# Altium footprint library LukaLIBRARY.PcbLib: 784 footprints (part 34 of 49)
Each footprint in its own frame and in the unit in brackets; x right, y up, seen from the top. Pads: shape width x height; smd on the part's side, far side on the other; paste and mask are expansions set on the pad; w line width, h text height; cw(c..) or ccw(c..) is an arc to the next point about the centre after c.
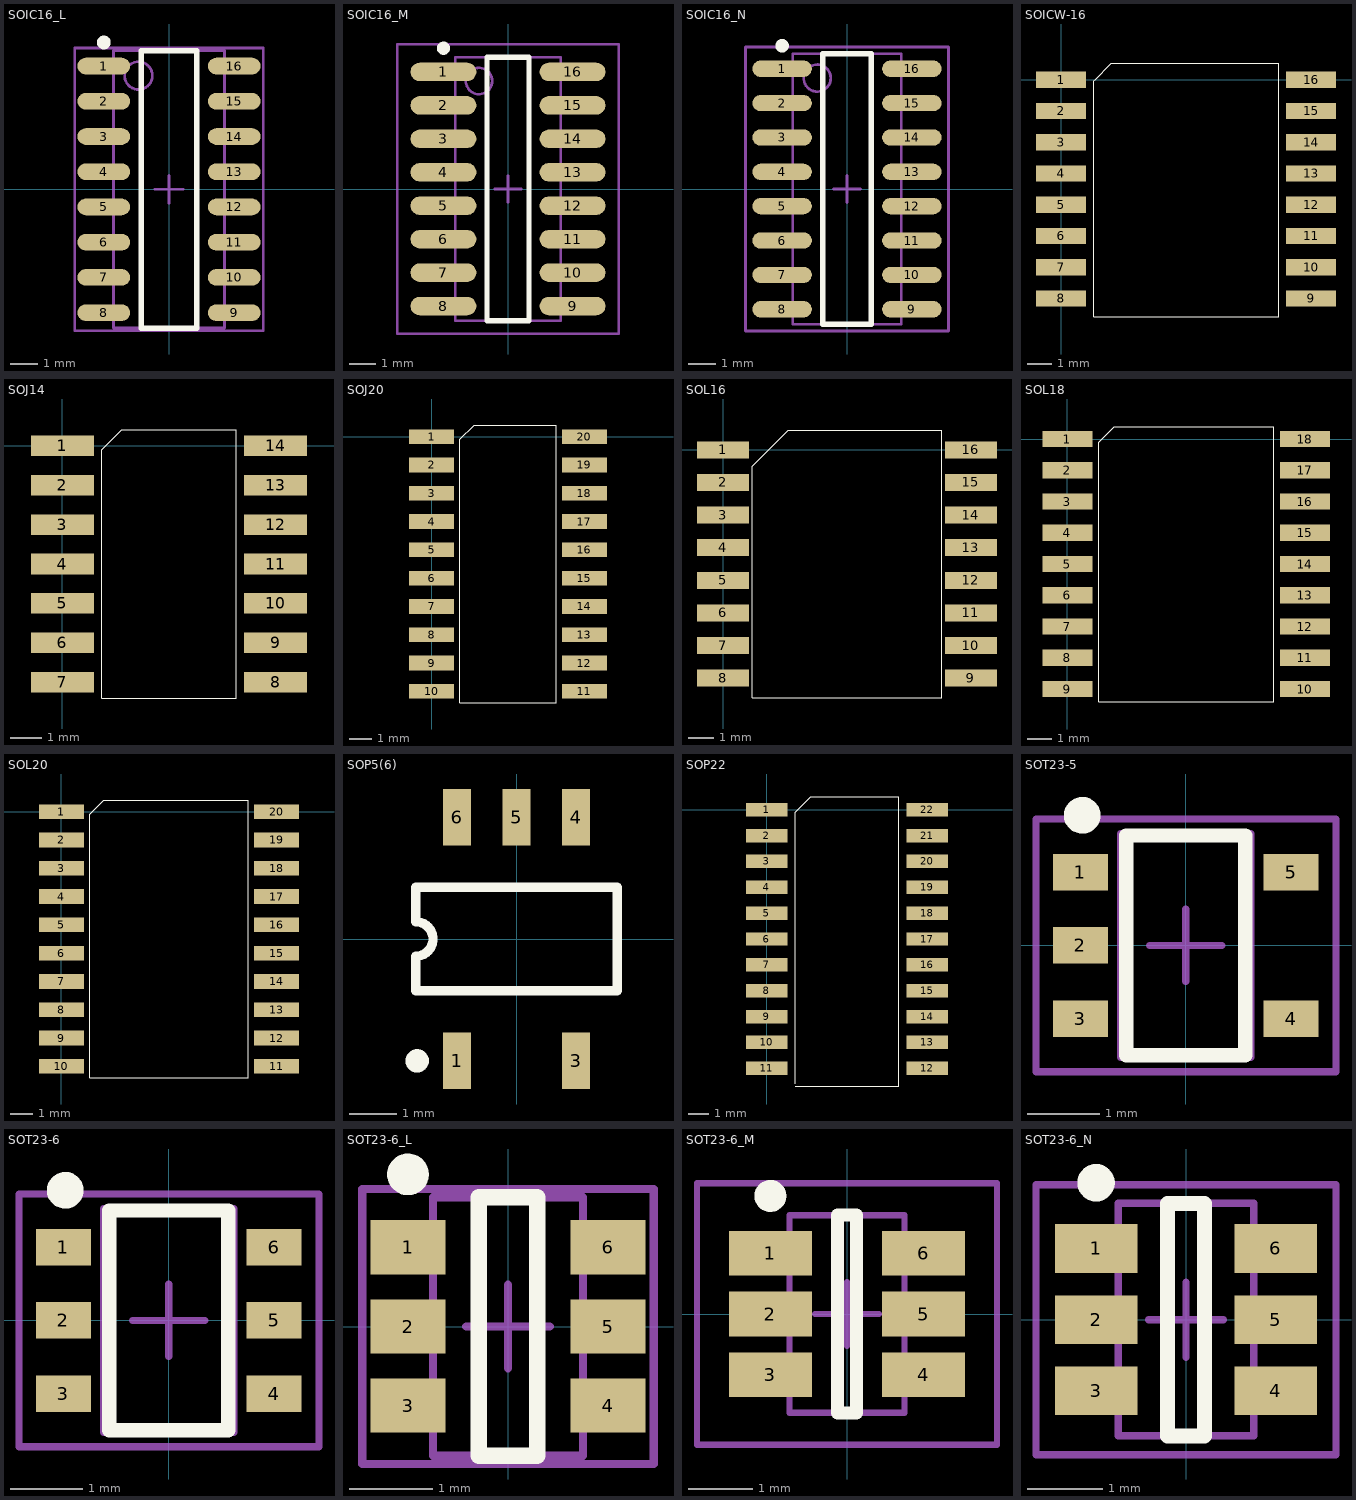
[diagram p33: the footprints below, top view; thin cyan lines are the x and y axes]

## SOIC16_L [mm] "SOIC, 16-Leads, Body 9.9x3.9mm, Pitch 1.27mm, IPC High Density"
height 1.91
pads (16):
  oval 1.9x0.6 smd: 1(-2.35,4.445) 2(-2.35,3.175) 3(-2.35,1.905) 4(-2.35,0.635) 5(-2.35,-0.635) 6(-2.35,-1.905) 7(-2.35,-3.175) 8(-2.35,-4.445) 9(2.35,-4.445) 10(2.35,-3.175) 11(2.35,-1.905) 12(2.35,-0.635) 13(2.35,0.635) 14(2.35,1.905) 15(2.35,3.175) 16(2.35,4.445)
Top Overlay:
  circle w0.25: c-2.35,5.295 r0.125
  lines w0.2: -1,-5 1,-5 1,5 -1,5 -1,-5
Mechanical 13:
  circle w0.1: c-1.1,4.1 r0.5
  lines w0.1: -2,-5 2,-5 2,5 -2,5 -2,-5
Mechanical 15:
  lines w0.1: -0.5,0 0.5,0 ; 0,-0.5 0,0.5 ; -3.4,-5.1 3.4,-5.1 3.4,5.1 -3.4,5.1 -3.4,-5.1
3D body: height 1.91, standoff 0, extent -2,-5 2,5

## SOIC16_M [mm] "SOIC, 16-Leads, Body 9.9x3.9mm, Pitch 1.27mm, IPC Low Density"
height 1.91
pads (16):
  oval 2.5x0.7 smd: 1(-2.45,4.445) 2(-2.45,3.175) 3(-2.45,1.905) 4(-2.45,0.635) 5(-2.45,-0.635) 6(-2.45,-1.905) 7(-2.45,-3.175) 8(-2.45,-4.445) 9(2.45,-4.445) 10(2.45,-3.175) 11(2.45,-1.905) 12(2.45,-0.635) 13(2.45,0.635) 14(2.45,1.905) 15(2.45,3.175) 16(2.45,4.445)
Top Overlay:
  circle w0.25: c-2.45,5.345 r0.125
  lines w0.2: -0.8,-5 0.8,-5 0.8,5 -0.8,5 -0.8,-5
Mechanical 13:
  circle w0.1: c-1.1,4.1 r0.5
  lines w0.1: -2,-5 2,-5 2,5 -2,5 -2,-5
Mechanical 15:
  lines w0.1: -0.5,0 0.5,0 ; 0,-0.5 0,0.5 ; -4.2,-5.5 4.2,-5.5 4.2,5.5 -4.2,5.5 -4.2,-5.5
3D body: height 1.91, standoff 0, extent -2,-5 2,5

## SOIC16_N [mm] "SOIC, 16-Leads, Body 9.9x3.9mm, Pitch 1.27mm, IPC Medium Density"
height 1.91
pads (16):
  oval 2.2x0.6 smd: 1(-2.4,4.445) 2(-2.4,3.175) 3(-2.4,1.905) 4(-2.4,0.635) 5(-2.4,-0.635) 6(-2.4,-1.905) 7(-2.4,-3.175) 8(-2.4,-4.445) 9(2.4,-4.445) 10(2.4,-3.175) 11(2.4,-1.905) 12(2.4,-0.635) 13(2.4,0.635) 14(2.4,1.905) 15(2.4,3.175) 16(2.4,4.445)
Top Overlay:
  circle w0.25: c-2.4,5.295 r0.125
  lines w0.2: -0.9,-5 -0.9,5 0.9,5 0.9,-5 -0.9,-5
Mechanical 13:
  circle w0.1: c-1.1,4.1 r0.5
  lines w0.1: -2,-5 -2,5 2,5 2,-5 -2,-5
Mechanical 15:
  lines w0.1: -0.5,0 0.5,0 ; 0,-0.5 0,0.5 ; -3.75,-5.25 -3.75,5.25 3.75,5.25 3.75,-5.25 -3.75,-5.25
3D body: height 1.91, standoff 0, extent -2,-5 2,5

## SOICW-16 [mil]
pads (16):
  rect 80x26 smd mask-1000: 1(0,0) 2(0,-50) 3(0,-100) 4(0,-150) 5(0,-200) 6(0,-250) 7(0,-300) 8(0,-350) 9(400,-350) 10(400,-300) 11(400,-250) 12(400,-200) 13(400,-150) 14(400,-100) 15(400,-50) 16(400,0)
Top Overlay:
  lines w1: 52.76,-1.57 52.76,-379.53 348.03,-379.53 348.03,25.98 80.31,25.98 53.94,-1.06
Top Solder:
  region: 360,-113 440,-113 440,-87 360,-87
  region: 360,-13 440,-13 440,13 360,13
  region: 360,-63 440,-63 440,-37 360,-37
  region: 360,-163 440,-163 440,-137 360,-137
  region: 360,-213 440,-213 440,-187 360,-187
  region: 360,-263 440,-263 440,-237 360,-237
  region: 360,-313 440,-313 440,-287 360,-287
  region: 360,-363 440,-363 440,-337 360,-337
  region: -40,-113 40,-113 40,-87 -40,-87
  region: -40,-63 40,-63 40,-37 -40,-37
  region: -40,-13 40,-13 40,13 -40,13
  region: -40,-213 40,-213 40,-187 -40,-187
  region: -40,-163 40,-163 40,-137 -40,-137
  region: -40,-363 40,-363 40,-337 -40,-337
  region: -40,-313 40,-313 40,-287 -40,-287
  region: -40,-263 40,-263 40,-237 -40,-237

## SOJ14 [mil]
pads (14):
  rect 80x26 smd mask-1000: 1(0,0) 2(0,-50) 3(0,-100) 4(0,-150) 5(0,-200) 6(0,-250) 7(0,-300) 8(270,-300) 9(270,-250) 10(270,-200) 11(270,-150) 12(270,-100) 13(270,-50) 14(270,0)
Top Overlay:
  lines w1: 50,-320 50,-5 75,20 220,20 220,-320 50,-320
Top Solder:
  region: -40,-163 40,-163 40,-137 -40,-137
  region: -40,-213 40,-213 40,-187 -40,-187
  region: -40,-263 40,-263 40,-237 -40,-237
  region: -40,-313 40,-313 40,-287 -40,-287
  region: -40,-13 40,-13 40,13 -40,13
  region: -40,-63 40,-63 40,-37 -40,-37
  region: 230,-313 310,-313 310,-287 230,-287
  region: 230,-263 310,-263 310,-237 230,-237
  region: 230,-213 310,-213 310,-187 230,-187
  region: 230,-163 310,-163 310,-137 230,-137
  region: 230,-63 310,-63 310,-37 230,-37
  region: 230,-13 310,-13 310,13 230,13
  region: -40,-113 40,-113 40,-87 -40,-87
  region: 230,-113 310,-113 310,-87 230,-87

## SOJ20 [mil]
pads (20):
  rect 80x26 smd mask-1000: 1(0,0) 2(0,-50) 3(0,-100) 4(0,-150) 5(0,-200) 6(0,-250) 7(0,-300) 8(0,-350) 9(0,-400) 10(0,-450) 11(270,-450) 12(270,-400) 13(270,-350) 14(270,-300) 15(270,-250) 16(270,-200) 17(270,-150) 18(270,-100) 19(270,-50) 20(270,0)
Top Overlay:
  lines w1: 50,-470 50,-5 75,20 220,20 220,-470 50,-470
Top Solder:
  region: -40,-263 40,-263 40,-237 -40,-237
  region: -40,-313 40,-313 40,-287 -40,-287
  region: -40,-363 40,-363 40,-337 -40,-337
  region: -40,-413 40,-413 40,-387 -40,-387
  region: -40,-463 40,-463 40,-437 -40,-437
  region: -40,-13 40,-13 40,13 -40,13
  region: -40,-63 40,-63 40,-37 -40,-37
  region: -40,-113 40,-113 40,-87 -40,-87
  region: -40,-163 40,-163 40,-137 -40,-137
  region: 230,-463 310,-463 310,-437 230,-437
  region: 230,-413 310,-413 310,-387 230,-387
  region: 230,-363 310,-363 310,-337 230,-337
  region: 230,-313 310,-313 310,-287 230,-287
  region: 230,-263 310,-263 310,-237 230,-237
  region: 230,-163 310,-163 310,-137 230,-137
  region: 230,-113 310,-113 310,-87 230,-87
  region: 230,-63 310,-63 310,-37 230,-37
  region: 230,-13 310,-13 310,13 230,13
  region: -40,-213 40,-213 40,-187 -40,-187
  region: 230,-213 310,-213 310,-187 230,-187

## SOL16 [mil]
pads (16):
  rect 80x26 smd mask-1000: 1(0,0) 2(0,-50) 3(0,-100) 4(0,-150) 5(0,-200) 6(0,-250) 7(0,-300) 8(0,-350) 9(380,-350) 10(380,-300) 11(380,-250) 12(380,-200) 13(380,-150) 14(380,-100) 15(380,-50) 16(380,0)
Top Overlay:
  lines w1: 45,-380 45,-25 100,30 335,30 335,-380 45,-380
Top Solder:
  region: -40,-263 40,-263 40,-237 -40,-237
  region: -40,-313 40,-313 40,-287 -40,-287
  region: -40,-363 40,-363 40,-337 -40,-337
  region: -40,-13 40,-13 40,13 -40,13
  region: -40,-63 40,-63 40,-37 -40,-37
  region: -40,-113 40,-113 40,-87 -40,-87
  region: -40,-163 40,-163 40,-137 -40,-137
  region: 340,-363 420,-363 420,-337 340,-337
  region: 340,-313 420,-313 420,-287 340,-287
  region: 340,-263 420,-263 420,-237 340,-237
  region: 340,-163 420,-163 420,-137 340,-137
  region: 340,-113 420,-113 420,-87 340,-87
  region: 340,-63 420,-63 420,-37 340,-37
  region: 340,-13 420,-13 420,13 340,13
  region: -40,-213 40,-213 40,-187 -40,-187
  region: 340,-213 420,-213 420,-187 340,-187

## SOL18 [mil]
pads (18):
  rect 80x26 smd mask-1000: 1(0,0) 2(0,-50) 3(0,-100) 4(0,-150) 5(0,-200) 6(0,-250) 7(0,-300) 8(0,-350) 9(0,-400) 10(380,-400) 11(380,-350) 12(380,-300) 13(380,-250) 14(380,-200) 15(380,-150) 16(380,-100) 17(380,-50) 18(380,0)
Top Overlay:
  lines w1: 50,-420 50,-5 75,20 330,20 330,-420 50,-420
Top Solder:
  region: -40,-263 40,-263 40,-237 -40,-237
  region: -40,-313 40,-313 40,-287 -40,-287
  region: -40,-363 40,-363 40,-337 -40,-337
  region: -40,-413 40,-413 40,-387 -40,-387
  region: -40,-13 40,-13 40,13 -40,13
  region: -40,-63 40,-63 40,-37 -40,-37
  region: -40,-113 40,-113 40,-87 -40,-87
  region: -40,-163 40,-163 40,-137 -40,-137
  region: 340,-413 420,-413 420,-387 340,-387
  region: 340,-363 420,-363 420,-337 340,-337
  region: 340,-313 420,-313 420,-287 340,-287
  region: 340,-263 420,-263 420,-237 340,-237
  region: 340,-163 420,-163 420,-137 340,-137
  region: 340,-113 420,-113 420,-87 340,-87
  region: 340,-63 420,-63 420,-37 340,-37
  region: 340,-13 420,-13 420,13 340,13
  region: -40,-213 40,-213 40,-187 -40,-187
  region: 340,-213 420,-213 420,-187 340,-187

## SOL20 [mil]
pads (20):
  rect 80x26 smd mask-1000: 1(0,0) 2(0,-50) 3(0,-100) 4(0,-150) 5(0,-200) 6(0,-250) 7(0,-300) 8(0,-350) 9(0,-400) 10(0,-450) 11(380,-450) 12(380,-400) 13(380,-350) 14(380,-300) 15(380,-250) 16(380,-200) 17(380,-150) 18(380,-100) 19(380,-50) 20(380,0)
Top Overlay:
  lines w1: 50,-470 50,-5 75,20 330,20 330,-470 50,-470
Top Solder:
  region: -40,-263 40,-263 40,-237 -40,-237
  region: -40,-313 40,-313 40,-287 -40,-287
  region: -40,-363 40,-363 40,-337 -40,-337
  region: -40,-413 40,-413 40,-387 -40,-387
  region: -40,-463 40,-463 40,-437 -40,-437
  region: -40,-13 40,-13 40,13 -40,13
  region: -40,-63 40,-63 40,-37 -40,-37
  region: -40,-113 40,-113 40,-87 -40,-87
  region: -40,-163 40,-163 40,-137 -40,-137
  region: 340,-463 420,-463 420,-437 340,-437
  region: 340,-413 420,-413 420,-387 340,-387
  region: 340,-363 420,-363 420,-337 340,-337
  region: 340,-313 420,-313 420,-287 340,-287
  region: 340,-263 420,-263 420,-237 340,-237
  region: 340,-163 420,-163 420,-137 340,-137
  region: 340,-113 420,-113 420,-87 340,-87
  region: 340,-63 420,-63 420,-37 340,-37
  region: 340,-13 420,-13 420,13 340,13
  region: -40,-213 40,-213 40,-187 -40,-187
  region: 340,-213 420,-213 420,-187 340,-187

## SOP5(6) [mm] "Small Outline; 6 Leads (1 Absent); Body Width 4.4 mm; Pitch 1.27 mm"
height 2.4
pads (5):
  rect 0.6x1.2 smd: 1(-1.27,-2.6) 3(1.27,-2.6) 4(1.27,2.6) 5(0,2.6) 6(-1.27,2.6)
Top Overlay:
  circle w0.25: c-2.12,-2.6 r0.125
  lines w0.2: -2.15,-1.1 2.15,-1.1 2.15,1.1 -2.15,1.1 -2.15,0.367 cw(c-2.15,0) -2.15,-0.367 -2.15,-1.1

## SOP22 [mil]
pads (22):
  rect 80x26 smd mask-1000: 1(0,0) 2(0,-50) 3(0,-100) 4(0,-150) 5(0,-200) 6(0,-250) 7(0,-300) 8(0,-350) 9(0,-400) 10(0,-450) 11(0,-500) 12(310,-500) 13(310,-450) 14(310,-400) 15(310,-350) 16(310,-300) 17(310,-250) 18(310,-200) 19(310,-150) 20(310,-100) 21(310,-50) 22(310,0)
Top Overlay:
  lines w1: 55,-535 255,-535 255,25 85,25 55,-5 55,-530
Top Solder:
  region: -40,-363 40,-363 40,-337 -40,-337
  region: -40,-413 40,-413 40,-387 -40,-387
  region: -40,-463 40,-463 40,-437 -40,-437
  region: 40,-487 -40,-487 -40,-513 40,-513
  region: -40,-63 40,-63 40,-37 -40,-37
  region: -40,-113 40,-113 40,-87 -40,-87
  region: -40,-163 40,-163 40,-137 -40,-137
  region: -40,-213 40,-213 40,-187 -40,-187
  region: -40,-263 40,-263 40,-237 -40,-237
  region: 350,-387 270,-387 270,-413 350,-413
  region: 350,-487 270,-487 270,-513 350,-513
  region: 350,-437 270,-437 270,-463 350,-463
  region: 270,-363 350,-363 350,-337 270,-337
  region: 270,-213 350,-213 350,-187 270,-187
  region: 270,-163 350,-163 350,-137 270,-137
  region: 270,-113 350,-113 350,-87 270,-87
  region: 270,-63 350,-63 350,-37 270,-37
  region: 270,-263 350,-263 350,-237 270,-237
  region: -40,-313 40,-313 40,-287 -40,-287
  region: -40,-13 40,-13 40,13 -40,13
  region: 270,-313 350,-313 350,-287 270,-287
  region: 270,-13 350,-13 350,13 270,13

## SOT23-5 [mil]
pads (5):
  rect 30x20 smd: 1(-57.5,40) 2(-57.5,0) 3(-57.5,-40) 4(57.5,-40) 5(57.5,40)
Top Overlay:
  circle w10: c-56.5,71 r5
  lines w7.87: -32.5,-60 32.5,-60 32.5,60 -32.5,60 -32.5,-60
Mechanical 13:
  lines w3.94: -35.43,-61.02 35.43,-61.02 35.43,61.02 -35.43,61.02 -35.43,-61.02
Mechanical 15:
  lines w3.94: -19.68,0 19.68,0 ; 0,-19.68 0,19.69 ; -81.74,-69 -81.74,69 82,69 82,-69 -81.74,-69
3D body: height 57.09, standoff 0, extent -35.43,-61.02 35.43,61.02

## SOT23-6 [mil]
pads (6):
  rect 30x20 smd: 1(-57.5,40) 2(-57.5,0) 3(-57.5,-40) 4(57.5,-40) 5(57.5,0) 6(57.5,40)
Top Overlay:
  circle w10: c-56.5,71 r5
  lines w7.87: -32.5,-60 32.5,-60 32.5,60 -32.5,60 -32.5,-60
Mechanical 13:
  lines w3.94: -35.43,-61.02 35.44,-61.02 35.44,61.03 -35.43,61.03 -35.43,-61.02
Mechanical 15:
  lines w3.94: -19.68,0 19.69,0 ; 0,-19.68 0,19.69 ; -81.74,-69 -81.74,69 82,69 82,-69 -81.74,-69
3D body: height 57.09, standoff 0, extent -35.43,-61.02 35.44,61.03

## SOT23-6_L [mm] "SOT23, 6-Leads, Body 2.9x1.6mm, Pitch 0.95mm, Lead Span 2.7mm, IPC High Density"
height 1.45
pads (6):
  rect 0.9x0.65 smd: 1(-1.2,0.95) 2(-1.2,0) 3(-1.2,-0.95) 4(1.2,-0.95) 5(1.2,0) 6(1.2,0.95)
Top Overlay:
  circle w0.25: c-1.2,1.825 r0.125
  lines w0.2: -0.35,-1.55 -0.35,1.55 0.35,1.55 0.35,-1.55 -0.35,-1.55
Mechanical 13:
  lines w0.1: -0.9,-1.55 0.9,-1.55 0.9,1.55 -0.9,1.55 -0.9,-1.55
Mechanical 15:
  lines w0.1: -0.5,0 0.5,0 ; 0,-0.5 0,0.5 ; -1.75,-1.65 1.75,-1.65 1.75,1.65 -1.75,1.65 -1.75,-1.65
3D body: height 1.45, standoff 0, extent -0.9,-1.55 0.9,1.55

## SOT23-6_M [mm] "SOT23, 6-Leads, Body 2.9x1.6mm, Pitch 0.95mm, Lead Span 2.7mm, IPC Low Density"
height 1.45
pads (6):
  rect 1.3x0.7 smd: 1(-1.2,0.95) 2(-1.2,0) 3(-1.2,-0.95) 4(1.2,-0.95) 5(1.2,0) 6(1.2,0.95)
Top Overlay:
  circle w0.25: c-1.2,1.85 r0.125
  lines w0.2: -0.15,-1.55 -0.15,1.55 0.15,1.55 0.15,-1.55 -0.15,-1.55
Mechanical 13:
  lines w0.1: -0.9,-1.55 0.9,-1.55 0.9,1.55 -0.9,1.55 -0.9,-1.55
Mechanical 15:
  lines w0.1: -0.5,0 0.5,0 ; 0,-0.5 0,0.5 ; -2.35,-2.05 2.35,-2.05 2.35,2.05 -2.35,2.05 -2.35,-2.05
3D body: height 1.45, standoff 0, extent -0.9,-1.55 0.9,1.55

## SOT23-6_N [mm] "SOT23, 6-Leads, Body 2.9x1.6mm, Pitch 0.95mm, Lead Span 2.7mm, IPC Medium Density"
height 1.45
pads (6):
  rect 1.1x0.65 smd: 1(-1.2,0.95) 2(-1.2,0) 3(-1.2,-0.95) 4(1.2,-0.95) 5(1.2,0) 6(1.2,0.95)
Top Overlay:
  circle w0.25: c-1.2,1.825 r0.125
  lines w0.2: -0.25,-1.55 -0.25,1.55 0.25,1.55 0.25,-1.55 -0.25,-1.55
Mechanical 13:
  lines w0.1: -0.9,-1.55 0.9,-1.55 0.9,1.55 -0.9,1.55 -0.9,-1.55
Mechanical 15:
  lines w0.1: -0.5,0 0.5,0 ; 0,-0.5 0,0.5 ; -2,-1.8 2,-1.8 2,1.8 -2,1.8 -2,-1.8
3D body: height 1.45, standoff 0, extent -0.9,-1.55 0.9,1.55